# Altium footprint library CONN_TBLOCK.PcbLib: 60 footprints (part 3 of 4)
Each footprint in its own frame and in the unit in brackets; x right, y up, seen from the top. Pads: shape width x height; smd on the part's side, far side on the other; paste and mask are expansions set on the pad; w line width, h text height; cw(c..) or ccw(c..) is an arc to the next point about the centre after c.
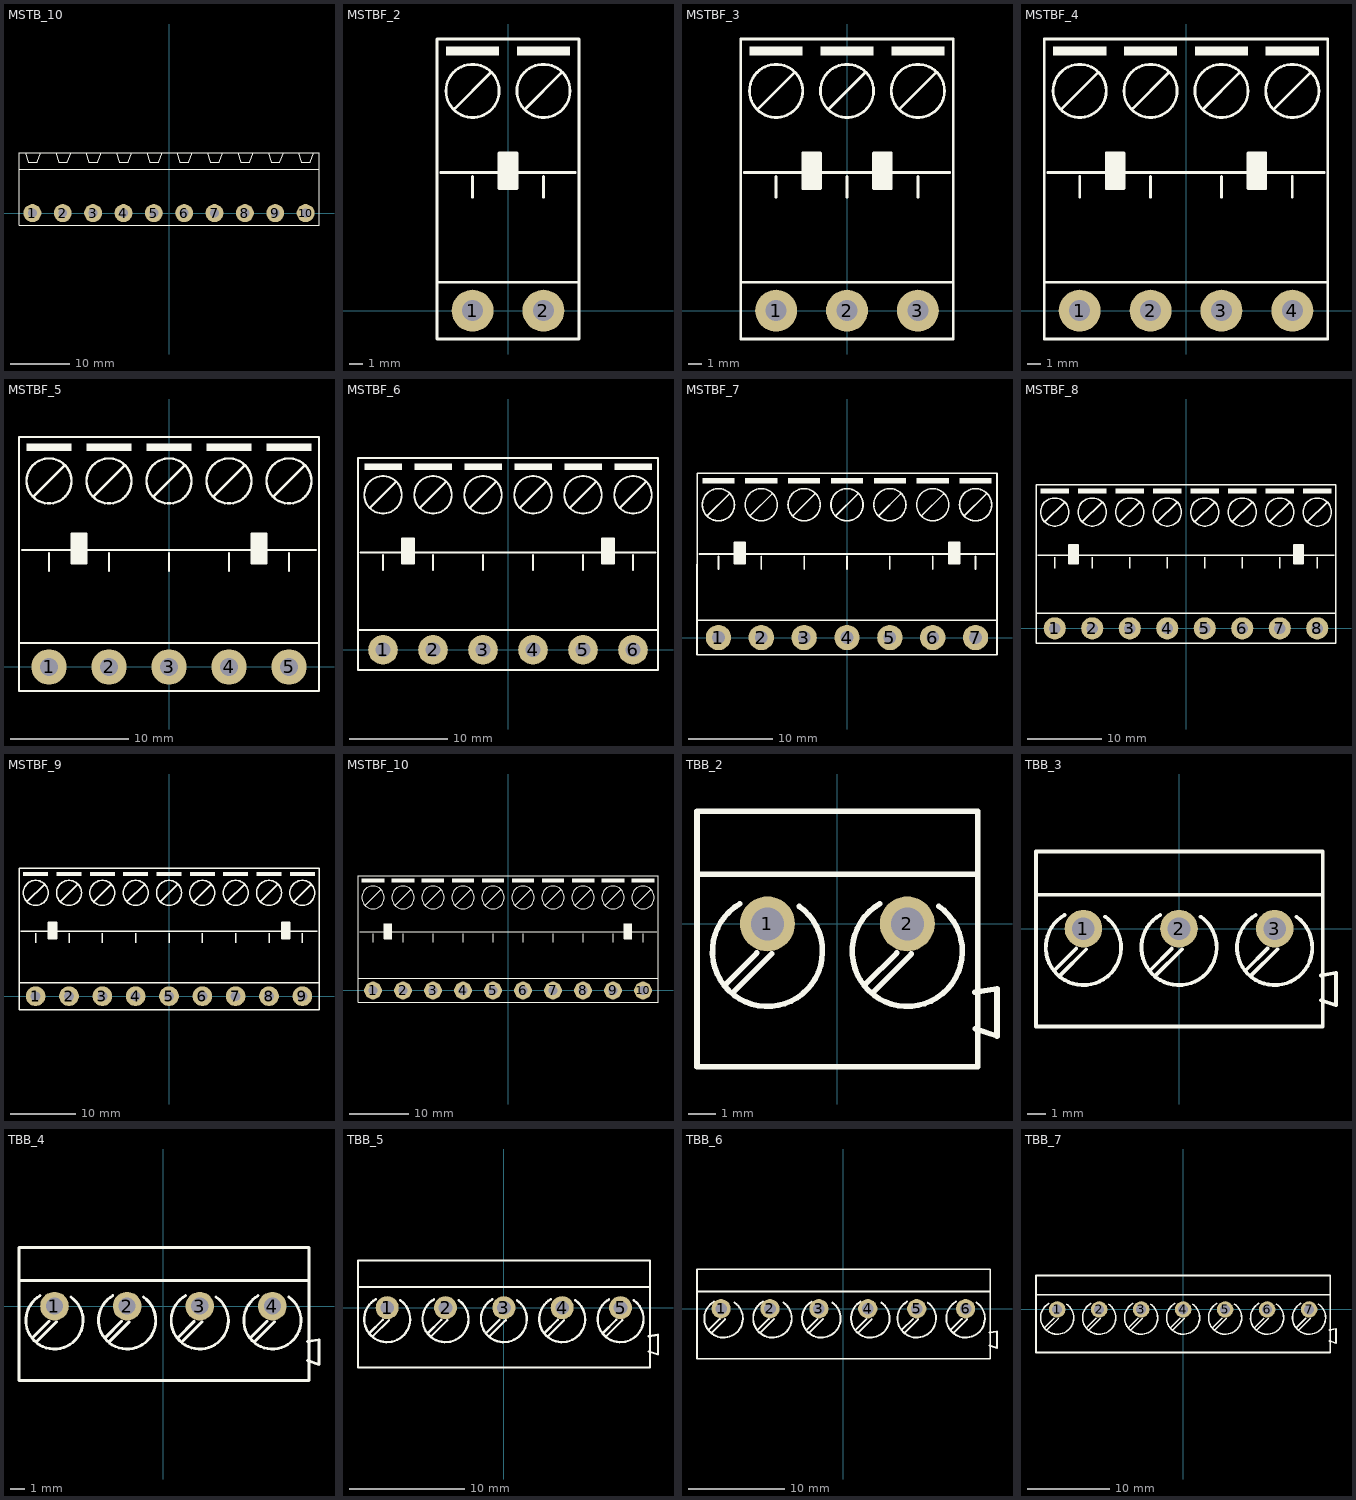
[diagram p2: the footprints below, top view; thin cyan lines are the x and y axes]

## MSTB_10 [mm] "PHOENIX MSTB 2, 5-G, 5.08mm pitch"
pads (10):
  round 3 hole 1.5: 1(-22.86,0) 2(-17.78,0) 3(-12.7,0) 4(-7.62,0) 5(-2.54,0) 6(2.54,0) 7(7.62,0) 8(12.7,0) 9(17.78,0) 10(22.86,0)
Top Overlay:
  lines w0.2: -25.1,7.3 25.1,7.3 ; -24.07,10.1 -23.57,8.5 -22.07,8.5 -21.47,10.1 ; -18.99,10.1 -18.49,8.5 -16.99,8.5 -16.39,10.1 ; -13.91,10.1 -13.41,8.5 -11.91,8.5 -11.31,10.1 ; -8.83,10.1 -8.33,8.5 -6.83,8.5 -6.23,10.1 ; -3.75,10.1 -3.25,8.5 -1.75,8.5 -1.15,10.1 ; 1.33,10.1 1.83,8.5 3.33,8.5 3.93,10.1 ; 6.41,10.1 6.91,8.5 8.41,8.5 9.01,10.1 ; 11.49,10.1 11.99,8.5 13.49,8.5 14.09,10.1 ; 16.57,10.1 17.07,8.5 18.57,8.5 19.17,10.1 ; 21.65,10.1 22.15,8.5 23.65,8.5 24.25,10.1 ; -25.1,-2.032 25.1,-2.032 25.1,10.1 -25.1,10.1 -25.1,-2.032
3D body "PHOENIX_MSTB10.stp": height 8.6, standoff -3.5, extent -25,-2 25,10

## MSTBF_2 [mm] "PHOENIX MSTB 2, 5-G, 5.08mm pitch, 2pin"
pads (2):
  round 3 hole 1.5: 1(-2.54,0) 2(2.54,0)
Top Overlay:
  circle w0.2: c-2.54,15.748 r1.905
  circle w0.2: c2.54,15.748 r1.905
  region: -0.635,18.923 -4.445,18.923 -4.445,18.288 -0.635,18.288
  region: 4.445,18.923 0.635,18.923 0.635,18.288 4.445,18.288
  region: 0.635,11.303 -0.635,11.303 -0.635,8.763 0.635,8.763
  lines w0.2: -5.08,2.032 5.08,2.032 ; -4.826,9.906 4.826,9.906 ; -3.81,14.478 -1.27,17.018 ; -2.54,8.128 -2.54,9.618 ; 1.27,14.478 3.81,17.018 ; 2.54,8.128 2.54,9.618 ; -5.08,-2.032 -5.08,19.468 5.08,19.468 5.08,-2.032 -5.08,-2.032 ; -0.635,8.763 -0.635,11.303 0.635,11.303 0.635,8.763 -0.635,8.763
3D body "PHOENIX_MSTB2.stp": height 8.6, standoff -3.5, extent -5,-2 5,10
3D body "PHOENIX_MSTB2W.stp": height 15, standoff 0, extent -5,1 5,19.2

## MSTBF_3 [mm] "PHOENIX MSTB 2, 5-G, 5.08mm pitch, 3pin"
pads (3):
  round 3 hole 1.5: 1(-5.08,0) 2(0,0) 3(5.08,0)
Top Overlay:
  circle w0.2: c5.08,15.748 r1.905
  circle w0.2: c0,15.748 r1.905
  circle w0.2: c-5.08,15.748 r1.905
  rectangle: -3.175,8.763 -1.905,11.303
  region: 3.175,11.303 1.905,11.303 1.905,8.763 3.175,8.763
  region: 6.985,18.923 3.175,18.923 3.175,18.288 6.985,18.288
  region: 1.905,18.923 -1.905,18.923 -1.905,18.288 1.905,18.288
  region: -3.175,18.923 -6.985,18.923 -6.985,18.288 -3.175,18.288
  lines w0.2: -7.62,2.032 7.62,2.032 ; -7.366,9.906 7.366,9.906 ; -6.35,14.478 -3.81,17.018 ; -5.08,8.128 -5.08,9.618 ; -1.27,14.478 1.27,17.018 ; 0,8.128 0,9.618 ; 3.81,14.478 6.35,17.018 ; 5.08,8.128 5.08,9.618 ; -7.62,-2.032 -7.62,19.468 7.62,19.468 7.62,-2.032 -7.62,-2.032 ; -3.175,8.763 -1.905,8.763 -1.905,11.303 -3.175,11.303 -3.175,8.763 ; 1.905,8.763 3.175,8.763 3.175,11.303 1.905,11.303 1.905,8.763
3D body "PHOENIX_MSTB3w.stp": height 15, standoff 0, extent -7.5,1 7.5,19.2
3D body "PHOENIX_MSTB3.stp": height 8.6, standoff -3.5, extent -7.5,-2 7.5,10

## MSTBF_4 [mm] "PHOENIX MSTB 2, 5-G, 5.08mm pitch"
pads (4):
  round 3 hole 1.5: 1(-7.62,0) 2(-2.54,0) 3(2.54,0) 4(7.62,0)
Top Overlay:
  circle w0.2: c7.62,15.748 r1.905
  circle w0.2: c2.54,15.748 r1.905
  circle w0.2: c-2.54,15.748 r1.905
  circle w0.2: c-7.62,15.748 r1.905
  rectangle: -5.715,8.763 -4.445,11.303
  region: 5.715,11.303 4.445,11.303 4.445,8.763 5.715,8.763
  region: -5.715,18.923 -9.525,18.923 -9.525,18.288 -5.715,18.288
  region: 9.525,18.923 5.715,18.923 5.715,18.288 9.525,18.288
  region: 4.445,18.923 0.635,18.923 0.635,18.288 4.445,18.288
  region: -0.635,18.923 -4.445,18.923 -4.445,18.288 -0.635,18.288
  lines w0.2: -10.16,2.032 10.16,2.032 ; -9.906,9.906 9.906,9.906 ; -8.89,14.478 -6.35,17.018 ; -7.62,8.128 -7.62,9.618 ; -3.81,14.478 -1.27,17.018 ; -2.54,8.128 -2.54,9.618 ; 1.27,14.478 3.81,17.018 ; 2.54,8.128 2.54,9.618 ; 6.35,14.478 8.89,17.018 ; 7.62,8.128 7.62,9.618 ; -10.16,-2.032 -10.16,19.468 10.16,19.468 10.16,-2.032 -10.16,-2.032 ; -5.715,8.763 -4.445,8.763 -4.445,11.303 -5.715,11.303 -5.715,8.763 ; 4.445,8.763 5.715,8.763 5.715,11.303 4.445,11.303 4.445,8.763
3D body "PHOENIX_MSTB4w.stp": height 15, standoff 0, extent -10,1 10,19.2
3D body "PHOENIX_MSTB4.stp": height 8.6, standoff -3.5, extent -10,-2 10,10

## MSTBF_5 [mm] "PHOENIX MSTB 2, 5-G, 5.08mm pitch"
pads (5):
  round 3 hole 1.5: 1(-10.16,0) 2(-5.08,0) 3(0,0) 4(5.08,0) 5(10.16,0)
Top Overlay:
  circle w0.2: c10.16,15.748 r1.905
  circle w0.2: c5.08,15.748 r1.905
  circle w0.2: c0,15.748 r1.905
  circle w0.2: c-5.08,15.748 r1.905
  circle w0.2: c-10.16,15.748 r1.905
  rectangle: -8.255,8.763 -6.985,11.303
  region: 8.255,11.303 6.985,11.303 6.985,8.763 8.255,8.763
  region: -3.175,18.923 -6.985,18.923 -6.985,18.288 -3.175,18.288
  region: -8.255,18.923 -12.065,18.923 -12.065,18.288 -8.255,18.288
  region: 12.065,18.923 8.255,18.923 8.255,18.288 12.065,18.288
  region: 6.985,18.923 3.175,18.923 3.175,18.288 6.985,18.288
  region: 1.905,18.923 -1.905,18.923 -1.905,18.288 1.905,18.288
  lines w0.2: -12.7,2.032 12.7,2.032 ; -12.446,9.906 12.446,9.906 ; -11.43,14.478 -8.89,17.018 ; -10.16,8.128 -10.16,9.618 ; -6.35,14.478 -3.81,17.018 ; -5.08,8.128 -5.08,9.618 ; -1.27,14.478 1.27,17.018 ; 0,8.128 0,9.618 ; 3.81,14.478 6.35,17.018 ; 5.08,8.128 5.08,9.618 ; 8.89,14.478 11.43,17.018 ; 10.16,8.128 10.16,9.618 ; -12.7,-2.032 -12.7,19.468 12.7,19.468 12.7,-2.032 -12.7,-2.032 ; -8.255,8.763 -6.985,8.763 -6.985,11.303 -8.255,11.303 -8.255,8.763 ; 6.985,8.763 8.255,8.763 8.255,11.303 6.985,11.303 6.985,8.763
3D body "PHOENIX_MSTB5.stp": height 8.6, standoff -3.5, extent -12.5,-2 12.5,10
3D body "PHOENIX_MSTB5w.stp": height 14.47, standoff -0.53, extent -12.7,1 12.7,19.2

## MSTBF_6 [mm] "PHOENIX MSTB 2, 5-G, 5.08mm pitch"
pads (6):
  round 3 hole 1.5: 1(-12.7,0) 2(-7.62,0) 3(-2.54,0) 4(2.54,0) 5(7.62,0) 6(12.7,0)
Top Overlay:
  circle w0.2: c12.7,15.748 r1.905
  circle w0.2: c7.62,15.748 r1.905
  circle w0.2: c2.54,15.748 r1.905
  circle w0.2: c-2.54,15.748 r1.905
  circle w0.2: c-7.62,15.748 r1.905
  circle w0.2: c-12.7,15.748 r1.905
  rectangle: -10.795,8.763 -9.525,11.303
  region: 10.795,11.303 9.525,11.303 9.525,8.763 10.795,8.763
  region: -0.635,18.923 -4.445,18.923 -4.445,18.288 -0.635,18.288
  region: -10.795,18.923 -14.605,18.923 -14.605,18.288 -10.795,18.288
  region: -5.715,18.923 -9.525,18.923 -9.525,18.288 -5.715,18.288
  region: 14.605,18.923 10.795,18.923 10.795,18.288 14.605,18.288
  region: 9.525,18.923 5.715,18.923 5.715,18.288 9.525,18.288
  region: 4.445,18.923 0.635,18.923 0.635,18.288 4.445,18.288
  lines w0.2: -15.24,2.032 15.24,2.032 ; -15.24,19.468 -15.24,-2.032 15.24,-2.032 15.24,19.468 -15.21,19.468 ; -14.986,9.906 14.986,9.906 ; -13.97,14.478 -11.43,17.018 ; -12.7,8.128 -12.7,9.618 ; -8.89,14.478 -6.35,17.018 ; -7.62,8.128 -7.62,9.618 ; -3.81,14.478 -1.27,17.018 ; -2.54,8.128 -2.54,9.618 ; 1.27,14.478 3.81,17.018 ; 2.54,8.128 2.54,9.618 ; 6.35,14.478 8.89,17.018 ; 7.62,8.128 7.62,9.618 ; 11.43,14.478 13.97,17.018 ; 12.7,8.128 12.7,9.618 ; -10.795,8.763 -9.525,8.763 -9.525,11.303 -10.795,11.303 -10.795,8.763 ; 9.525,8.763 10.795,8.763 10.795,11.303 9.525,11.303 9.525,8.763
3D body "PHOENIX_MSTB6W.stp": height 15.07, standoff 0.07, extent -15.18,1 15.3,19.2
3D body "PHOENIX_MSTB6.stp": height 8.6, standoff -3.5, extent -15,-2 15,10

## MSTBF_7 [mm] "PHOENIX MSTB 2, 5-G, 5.08mm pitch"
pads (7):
  round 3 hole 1.5: 1(-15.24,0) 2(-10.16,0) 3(-5.08,0) 4(0,0) 5(5.08,0) 6(10.16,0) 7(15.24,0)
Top Overlay:
  circle w0.2: c-15.24,15.748 r1.905
  circle w0.2: c-10.16,15.748 r1.905
  circle w0.2: c-5.08,15.748 r1.905
  circle w0.2: c0,15.748 r1.905
  circle w0.2: c5.08,15.748 r1.905
  circle w0.2: c10.16,15.748 r1.905
  circle w0.2: c15.24,15.748 r1.905
  region: 13.335,11.303 12.065,11.303 12.065,8.763 13.335,8.763
  region: 6.985,18.923 3.175,18.923 3.175,18.288 6.985,18.288
  region: 12.065,18.923 8.255,18.923 8.255,18.288 12.065,18.288
  rectangle: -13.335,8.763 -12.065,11.303
  region: 17.145,18.923 13.335,18.923 13.335,18.288 17.145,18.288
  region: -3.175,18.923 -6.985,18.923 -6.985,18.288 -3.175,18.288
  region: -8.255,18.923 -12.065,18.923 -12.065,18.288 -8.255,18.288
  region: -13.335,18.923 -17.145,18.923 -17.145,18.288 -13.335,18.288
  region: 1.905,18.923 -1.905,18.923 -1.905,18.288 1.905,18.288
  lines w0.2: -17.78,2.032 17.78,2.032 ; -17.526,9.906 17.526,9.906 ; -16.51,14.478 -13.97,17.018 ; -15.24,8.128 -15.24,9.618 ; -11.43,14.478 -8.89,17.018 ; -10.16,8.128 -10.16,9.618 ; -6.35,14.478 -3.81,17.018 ; -5.08,8.128 -5.08,9.618 ; -1.27,14.478 1.27,17.018 ; 0,8.128 0,9.618 ; 3.81,14.478 6.35,17.018 ; 5.08,8.128 5.08,9.618 ; 8.89,14.478 11.43,17.018 ; 10.16,8.128 10.16,9.618 ; 13.97,14.478 16.51,17.018 ; 15.24,8.128 15.24,9.618 ; -17.78,-2.032 17.78,-2.032 17.78,19.468 -17.75,19.468 -17.78,-2.032 ; -13.335,8.763 -12.065,8.763 -12.065,11.303 -13.335,11.303 -13.335,8.763 ; 12.065,8.763 12.065,11.303 13.335,11.303 13.335,8.763 12.065,8.763
3D body "PHOENIX_MSTB6.stp": height 8.6, standoff -3.5, extent -17.5,-2 17.5,10
3D body "PHOENIX_MSTB7W.stp": height 15.07, standoff 0.07, extent -17.86,1 17.7,19.2

## MSTBF_8 [mm] "PHOENIX MSTB 2, 5-G, 5.08mm pitch"
pads (8):
  round 3 hole 1.5: 1(-17.78,0) 2(-12.7,0) 3(-7.62,0) 4(-2.54,0) 5(2.54,0) 6(7.62,0) 7(12.7,0) 8(17.78,0)
Top Overlay:
  circle w0.2: c-17.78,15.748 r1.905
  circle w0.2: c-12.7,15.748 r1.905
  circle w0.2: c-7.62,15.748 r1.905
  circle w0.2: c-2.54,15.748 r1.905
  circle w0.2: c2.54,15.748 r1.905
  circle w0.2: c7.62,15.748 r1.905
  circle w0.2: c12.7,15.748 r1.905
  circle w0.2: c17.78,15.748 r1.905
  region: 9.525,18.923 5.715,18.923 5.715,18.288 9.525,18.288
  region: 14.605,18.923 10.795,18.923 10.795,18.288 14.605,18.288
  region: 19.685,18.923 15.875,18.923 15.875,18.288 19.685,18.288
  region: -0.635,18.923 -4.445,18.923 -4.445,18.288 -0.635,18.288
  region: -5.715,18.923 -9.525,18.923 -9.525,18.288 -5.715,18.288
  region: -10.795,18.923 -14.605,18.923 -14.605,18.288 -10.795,18.288
  region: -15.875,18.923 -19.685,18.923 -19.685,18.288 -15.875,18.288
  region: 4.445,18.923 0.635,18.923 0.635,18.288 4.445,18.288
  region: -14.605,11.303 -15.875,11.303 -15.875,8.763 -14.605,8.763
  region: 15.875,11.303 14.605,11.303 14.605,8.763 15.875,8.763
  lines w0.2: -20.32,2.032 20.32,2.032 ; -20.066,9.906 20.066,9.906 ; -19.05,14.478 -16.51,17.018 ; -17.78,8.128 -17.78,9.618 ; -13.97,14.478 -11.43,17.018 ; -12.7,8.128 -12.7,9.618 ; -8.89,14.478 -6.35,17.018 ; -7.62,8.128 -7.62,9.618 ; -3.81,14.478 -1.27,17.018 ; -2.54,8.128 -2.54,9.618 ; 1.27,14.478 3.81,17.018 ; 2.54,8.128 2.54,9.618 ; 6.35,14.478 8.89,17.018 ; 7.62,8.128 7.62,9.618 ; 11.43,14.478 13.97,17.018 ; 12.7,8.128 12.7,9.618 ; 16.51,14.478 19.05,17.018 ; 17.78,8.128 17.78,9.618 ; -20.32,-2.032 -20.32,19.468 20.32,19.468 20.32,-2.032 -20.32,-2.032 ; -15.875,8.763 -14.605,8.763 -14.605,11.303 -15.875,11.303 -15.875,8.763 ; 14.605,8.763 14.605,11.303 15.875,11.303 15.875,8.763 14.605,8.763
3D body "PHOENIX_MSTB8W.stp": height 15.07, standoff 0.07, extent -20.34,1 20.3,19.2
3D body "PHOENIX_MSTB8.stp": height 8.6, standoff -3.5, extent -20,-2 20,10

## MSTBF_9 [mm] "PHOENIX MSTB 2, 5-G, 5.08mm pitch"
pads (9):
  round 3 hole 1.5: 1(-20.32,0) 2(-15.24,0) 3(-10.16,0) 4(-5.08,0) 5(0,0) 6(5.08,0) 7(10.16,0) 8(15.24,0) 9(20.32,0)
Top Overlay:
  circle w0.2: c-20.32,15.748 r1.905
  circle w0.2: c20.32,15.748 r1.905
  circle w0.2: c15.24,15.748 r1.905
  circle w0.2: c10.16,15.748 r1.905
  circle w0.2: c5.08,15.748 r1.905
  circle w0.2: c0,15.748 r1.905
  circle w0.2: c-5.08,15.748 r1.905
  circle w0.2: c-10.16,15.748 r1.905
  circle w0.2: c-15.24,15.748 r1.905
  region: -18.415,18.923 -22.225,18.923 -22.225,18.288 -18.415,18.288
  region: -17.145,11.303 -18.415,11.303 -18.415,8.763 -17.145,8.763
  region: 18.415,11.303 17.145,11.303 17.145,8.763 18.415,8.763
  region: 6.985,18.923 3.175,18.923 3.175,18.288 6.985,18.288
  region: -13.335,18.923 -17.145,18.923 -17.145,18.288 -13.335,18.288
  region: -8.255,18.923 -12.065,18.923 -12.065,18.288 -8.255,18.288
  region: -3.175,18.923 -6.985,18.923 -6.985,18.288 -3.175,18.288
  region: 1.905,18.923 -1.905,18.923 -1.905,18.288 1.905,18.288
  region: 22.225,18.923 18.415,18.923 18.415,18.288 22.225,18.288
  region: 17.145,18.923 13.335,18.923 13.335,18.288 17.145,18.288
  region: 12.065,18.923 8.255,18.923 8.255,18.288 12.065,18.288
  lines w0.2: -22.86,2.032 22.86,2.032 ; -22.606,9.906 22.606,9.906 ; -21.59,14.478 -19.05,17.018 ; -20.32,8.128 -20.32,9.618 ; -16.51,14.478 -13.97,17.018 ; -15.24,8.128 -15.24,9.618 ; -11.43,14.478 -8.89,17.018 ; -10.16,8.128 -10.16,9.618 ; -6.35,14.478 -3.81,17.018 ; -5.08,8.128 -5.08,9.618 ; -1.27,14.478 1.27,17.018 ; 0,8.128 0,9.618 ; 3.81,14.478 6.35,17.018 ; 5.08,8.128 5.08,9.618 ; 8.89,14.478 11.43,17.018 ; 10.16,8.128 10.16,9.618 ; 13.97,14.478 16.51,17.018 ; 15.24,8.128 15.24,9.618 ; 19.05,14.478 21.59,17.018 ; 20.32,8.128 20.32,9.618 ; -22.86,-2.032 -22.86,19.468 22.86,19.468 22.86,-2.032 -22.86,-2.032 ; -18.415,8.763 -18.415,11.303 -17.145,11.303 -17.145,8.763 -18.415,8.763 ; 17.145,8.763 18.415,8.763 18.415,11.303 17.145,11.303 17.145,8.763
3D body "PHOENIX_MSTB9W.stp": height 15.07, standoff 0.07, extent -22.82,1 22.9,19.2
3D body "PHOENIX_MSTB9.stp": height 8.6, standoff -3.5, extent -22.5,-2 22.5,10

## MSTBF_10 [mm] "PHOENIX MSTB 2, 5-G, 5.08mm pitch"
pads (10):
  round 3 hole 1.5: 1(-22.86,0) 2(-17.78,0) 3(-12.7,0) 4(-7.62,0) 5(-2.54,0) 6(2.54,0) 7(7.62,0) 8(12.7,0) 9(17.78,0) 10(22.86,0)
Top Overlay:
  circle w0.2: c-17.78,15.748 r1.905
  circle w0.2: c-22.86,15.748 r1.905
  circle w0.2: c22.86,15.748 r1.905
  circle w0.2: c17.78,15.748 r1.905
  circle w0.2: c12.7,15.748 r1.905
  circle w0.2: c7.62,15.748 r1.905
  circle w0.2: c2.54,15.748 r1.905
  circle w0.2: c-2.54,15.748 r1.905
  circle w0.2: c-7.62,15.748 r1.905
  circle w0.2: c-12.7,15.748 r1.905
  region: -20.955,18.923 -24.765,18.923 -24.765,18.288 -20.955,18.288
  region: -15.875,18.923 -19.685,18.923 -19.685,18.288 -15.875,18.288
  region: -19.685,11.303 -20.955,11.303 -20.955,8.763 -19.685,8.763
  region: 20.955,11.303 19.685,11.303 19.685,8.763 20.955,8.763
  region: 9.525,18.923 5.715,18.923 5.715,18.288 9.525,18.288
  region: -10.795,18.923 -14.605,18.923 -14.605,18.288 -10.795,18.288
  region: -5.715,18.923 -9.525,18.923 -9.525,18.288 -5.715,18.288
  region: -0.635,18.923 -4.445,18.923 -4.445,18.288 -0.635,18.288
  region: 4.445,18.923 0.635,18.923 0.635,18.288 4.445,18.288
  region: 24.765,18.923 20.955,18.923 20.955,18.288 24.765,18.288
  region: 19.685,18.923 15.875,18.923 15.875,18.288 19.685,18.288
  region: 14.605,18.923 10.795,18.923 10.795,18.288 14.605,18.288
  lines w0.2: -25.4,2.032 25.4,2.032 ; -25.146,9.906 25.146,9.906 ; -24.13,14.478 -21.59,17.018 ; -22.86,8.128 -22.86,9.618 ; -19.05,14.478 -16.51,17.018 ; -17.78,8.128 -17.78,9.618 ; -13.97,14.478 -11.43,17.018 ; -12.7,8.128 -12.7,9.618 ; -8.89,14.478 -6.35,17.018 ; -7.62,8.128 -7.62,9.618 ; -3.81,14.478 -1.27,17.018 ; -2.54,8.128 -2.54,9.618 ; 1.27,14.478 3.81,17.018 ; 2.54,8.128 2.54,9.618 ; 6.35,14.478 8.89,17.018 ; 7.62,8.128 7.62,9.618 ; 11.43,14.478 13.97,17.018 ; 12.7,8.128 12.7,9.618 ; 16.51,14.478 19.05,17.018 ; 17.78,8.128 17.78,9.618 ; 21.59,14.478 24.13,17.018 ; 22.86,8.128 22.86,9.618 ; -25.4,-2.032 -25.4,19.468 25.4,19.468 25.4,-2.032 -25.4,-2.032 ; -20.955,8.763 -20.955,11.303 -19.685,11.303 -19.685,8.763 -20.955,8.763 ; 19.685,8.763 20.955,8.763 20.955,11.303 19.685,11.303 19.685,8.763
3D body "PHOENIX_MSTB10.stp": height 8.6, standoff -3.5, extent -25,-2 25,10
3D body "PHOENIX_MSTB10W.stp": height 15.07, standoff 0.07, extent -25.4,1 25.4,19.2

## TBB_2 [mm] "Terminal Block Blue"
pads (2):
  round 2 / inner round 2 / far side rect 2.4x3 hole 1.2: 1(-2.54,0)
  round 2 / inner round 2 / far side oval 2.4x3 hole 1.2: 2(2.54,0)
Top Overlay:
  lines w0.2: -5.1,1.8 5.1,1.8 ; -4.071,-2.209 -2.921,-1.059 ; -3.789,-2.491 -2.389,-1.091 ; -3.54,0.732 ccw(c-2.54,-1) -1.393,0.638 ; 1.009,-2.209 2.159,-1.059 ; 1.291,-2.491 2.691,-1.091 ; 1.54,0.732 ccw(c2.54,-1) 3.687,0.638 ; 4.995,-2.484 5.8,-2.35 5.8,-4.075 5.004,-3.81 ; -5.1,-5.2 5.1,-5.2 5.1,4.1 -5.1,4.1 -5.1,-5.2
3D body "Socket Blue_2Pin.STEP": height 12.52, standoff -6.68, extent -4.965,-5.08 5.777,3.988

## TBB_3 [mm] "Terminal Block Blue"
pads (3):
  round 2 / inner round 2 / far side rect 2.4x3 hole 1.2: 1(-5.08,0)
  round 2 / inner round 2 / far side oval 2.4x3 hole 1.2: 2(0,0) 3(5.08,0)
Top Overlay:
  lines w0.2: -7.6,1.8 7.64,1.8 ; -6.611,-2.209 -5.461,-1.059 ; -6.329,-2.491 -4.929,-1.091 ; -6.08,0.732 ccw(c-5.08,-1) -3.933,0.638 ; -1.531,-2.209 -0.381,-1.059 ; -1.249,-2.491 0.151,-1.091 ; -1,0.732 ccw(c0,-1) 1.147,0.638 ; 3.549,-2.209 4.699,-1.059 ; 3.831,-2.491 5.231,-1.091 ; 4.08,0.732 ccw(c5.08,-1) 6.227,0.638 ; 7.535,-2.484 8.34,-2.35 8.34,-4.075 7.544,-3.81 ; -7.6,-5.2 7.64,-5.2 7.64,4.1 -7.6,4.1 -7.6,-5.2
3D body "Socket Blue_3Pin.STEP": height 12.78, standoff -6.43, extent -7.494,-5.069 8.328,3.999

## TBB_4 [mm] "Terminal Block Blue"
pads (4):
  round 2 / inner round 2 / far side rect 2.4x3 hole 1.2: 1(-7.62,0)
  round 2 / inner round 2 / far side oval 2.4x3 hole 1.2: 2(-2.54,0) 3(2.54,0) 4(7.62,0)
Top Overlay:
  lines w0.2: -10.1,1.8 10.18,1.8 ; -9.151,-2.209 -8.001,-1.059 ; -8.869,-2.491 -7.469,-1.091 ; -8.62,0.732 ccw(c-7.62,-1) -6.473,0.638 ; -4.071,-2.209 -2.921,-1.059 ; -3.789,-2.491 -2.389,-1.091 ; -3.54,0.732 ccw(c-2.54,-1) -1.393,0.638 ; 1.009,-2.209 2.159,-1.059 ; 1.291,-2.491 2.691,-1.091 ; 1.54,0.732 ccw(c2.54,-1) 3.687,0.638 ; 6.089,-2.209 7.239,-1.059 ; 6.371,-2.491 7.771,-1.091 ; 6.62,0.732 ccw(c7.62,-1) 8.767,0.638 ; 10.075,-2.484 10.88,-2.35 10.88,-4.075 10.084,-3.81 ; -10.1,-5.2 -10.1,4.1 10.18,4.1 10.18,-5.2 -10.1,-5.2
3D body "Socket Blue_4Pin.STEP": height 12.52, standoff -6.68, extent -10.031,-5.029 10.871,4.039

## TBB_5 [mm] "Terminal Block Blue"
pads (5):
  round 2 / inner round 2 / far side rect 2.4x3 hole 1.2: 1(-10.16,0)
  round 2 / inner round 2 / far side oval 2.4x3 hole 1.2: 2(-5.08,0) 3(0,0) 4(5.08,0) 5(10.16,0)
Top Overlay:
  lines w0.2: -12.7,1.8 12.72,1.8 ; -11.691,-2.209 -10.541,-1.059 ; -11.409,-2.491 -10.009,-1.091 ; -11.16,0.732 ccw(c-10.16,-1) -9.013,0.638 ; -6.611,-2.209 -5.461,-1.059 ; -6.329,-2.491 -4.929,-1.091 ; -6.08,0.732 ccw(c-5.08,-1) -3.933,0.638 ; -1.531,-2.209 -0.381,-1.059 ; -1.249,-2.491 0.151,-1.091 ; -1,0.732 ccw(c0,-1) 1.147,0.638 ; 3.549,-2.209 4.699,-1.059 ; 3.831,-2.491 5.231,-1.091 ; 4.08,0.732 ccw(c5.08,-1) 6.227,0.638 ; 8.629,-2.209 9.779,-1.059 ; 8.911,-2.491 10.311,-1.091 ; 9.16,0.732 ccw(c10.16,-1) 11.307,0.638 ; 12.615,-2.484 13.42,-2.35 13.42,-4.075 12.624,-3.81 ; -12.7,-5.2 -12.7,4.1 12.72,4.1 12.72,-5.2 -12.7,-5.2
3D body "Socket Blue_5Pin.STEP": height 12.52, standoff -6.68, extent -12.647,-5.042 13.335,4.026

## TBB_6 [mm] "Terminal Block Blue"
pads (6):
  round 2 / inner round 2 / far side rect 2.4x3 hole 1.2: 1(-12.7,0)
  round 2 / inner round 2 / far side oval 2.4x3 hole 1.2: 2(-7.62,0) 3(-2.54,0) 4(2.54,0) 5(7.62,0) 6(12.7,0)
Top Overlay:
  lines w0.2: -15.2,1.8 15.26,1.8 ; -13.971,-2.209 -12.821,-1.059 ; -13.689,-2.491 -12.289,-1.091 ; -13.44,0.732 ccw(c-12.44,-1) -11.293,0.638 ; -8.891,-2.209 -7.741,-1.059 ; -8.609,-2.491 -7.209,-1.091 ; -8.36,0.732 ccw(c-7.36,-1) -6.213,0.638 ; -3.811,-2.209 -2.661,-1.059 ; -3.529,-2.491 -2.129,-1.091 ; -3.28,0.732 ccw(c-2.28,-1) -1.133,0.638 ; 1.269,-2.209 2.419,-1.059 ; 1.551,-2.491 2.951,-1.091 ; 1.8,0.732 ccw(c2.8,-1) 3.947,0.638 ; 6.089,-2.209 7.239,-1.059 ; 6.371,-2.491 7.771,-1.091 ; 6.62,0.732 ccw(c7.62,-1) 8.767,0.638 ; 11.169,-2.209 12.319,-1.059 ; 11.451,-2.491 12.851,-1.091 ; 11.7,0.732 ccw(c12.7,-1) 13.847,0.638 ; 15.155,-2.484 15.96,-2.35 15.96,-4.075 15.164,-3.81 ; -15.2,-5.2 15.26,-5.2 15.26,4.1 -15.2,4.1 -15.2,-5.2
3D body "Socket Blue_6Pin.STEP": height 12.52, standoff -6.68, extent -15.138,-5.029 15.924,4.039

## TBB_7 [mm] "Terminal Block Blue"
pads (7):
  round 2 / inner round 2 / far side rect 2.4x3 hole 1.2: 1(-15.24,0)
  round 2 / inner round 2 / far side oval 2.4x3 hole 1.2: 2(-10.16,0) 3(-5.08,0) 4(0,0) 5(5.08,0) 6(10.16,0) 7(15.24,0)
Top Overlay:
  lines w0.2: -17.8,1.8 17.8,1.8 ; -16.771,-2.209 -15.621,-1.059 ; -16.489,-2.491 -15.089,-1.091 ; -16.24,0.732 ccw(c-15.24,-1) -14.093,0.638 ; -11.691,-2.209 -10.541,-1.059 ; -11.409,-2.491 -10.009,-1.091 ; -11.16,0.732 ccw(c-10.16,-1) -9.013,0.638 ; -6.611,-2.209 -5.461,-1.059 ; -6.329,-2.491 -4.929,-1.091 ; -6.08,0.732 ccw(c-5.08,-1) -3.933,0.638 ; -1.531,-2.209 -0.381,-1.059 ; -1.249,-2.491 0.151,-1.091 ; -1,0.732 ccw(c0,-1) 1.147,0.638 ; 3.549,-2.209 4.699,-1.059 ; 3.831,-2.491 5.231,-1.091 ; 4.08,0.732 ccw(c5.08,-1) 6.227,0.638 ; 8.629,-2.209 9.779,-1.059 ; 8.911,-2.491 10.311,-1.091 ; 9.16,0.732 ccw(c10.16,-1) 11.307,0.638 ; 13.709,-2.209 14.859,-1.059 ; 13.991,-2.491 15.391,-1.091 ; 14.24,0.732 ccw(c15.24,-1) 16.387,0.638 ; 17.695,-2.484 18.5,-2.35 18.5,-4.075 17.704,-3.81 ; -17.8,-5.2 17.8,-5.2 17.8,4.1 -17.8,4.1 -17.8,-5.2
3D body "Socket Blue_7Pin.STEP": height 12.52, standoff -6.68, extent -17.685,-5.025 18.457,4.042